# Altium footprint library 2.52-直插元件.PcbLib: 467 footprints (part 7 of 30)
Each footprint in its own frame and in the unit in brackets; x right, y up, seen from the top. Pads: shape width x height; smd on the part's side, far side on the other; paste and mask are expansions set on the pad; w line width, h text height; cw(c..) or ccw(c..) is an arc to the next point about the centre after c.
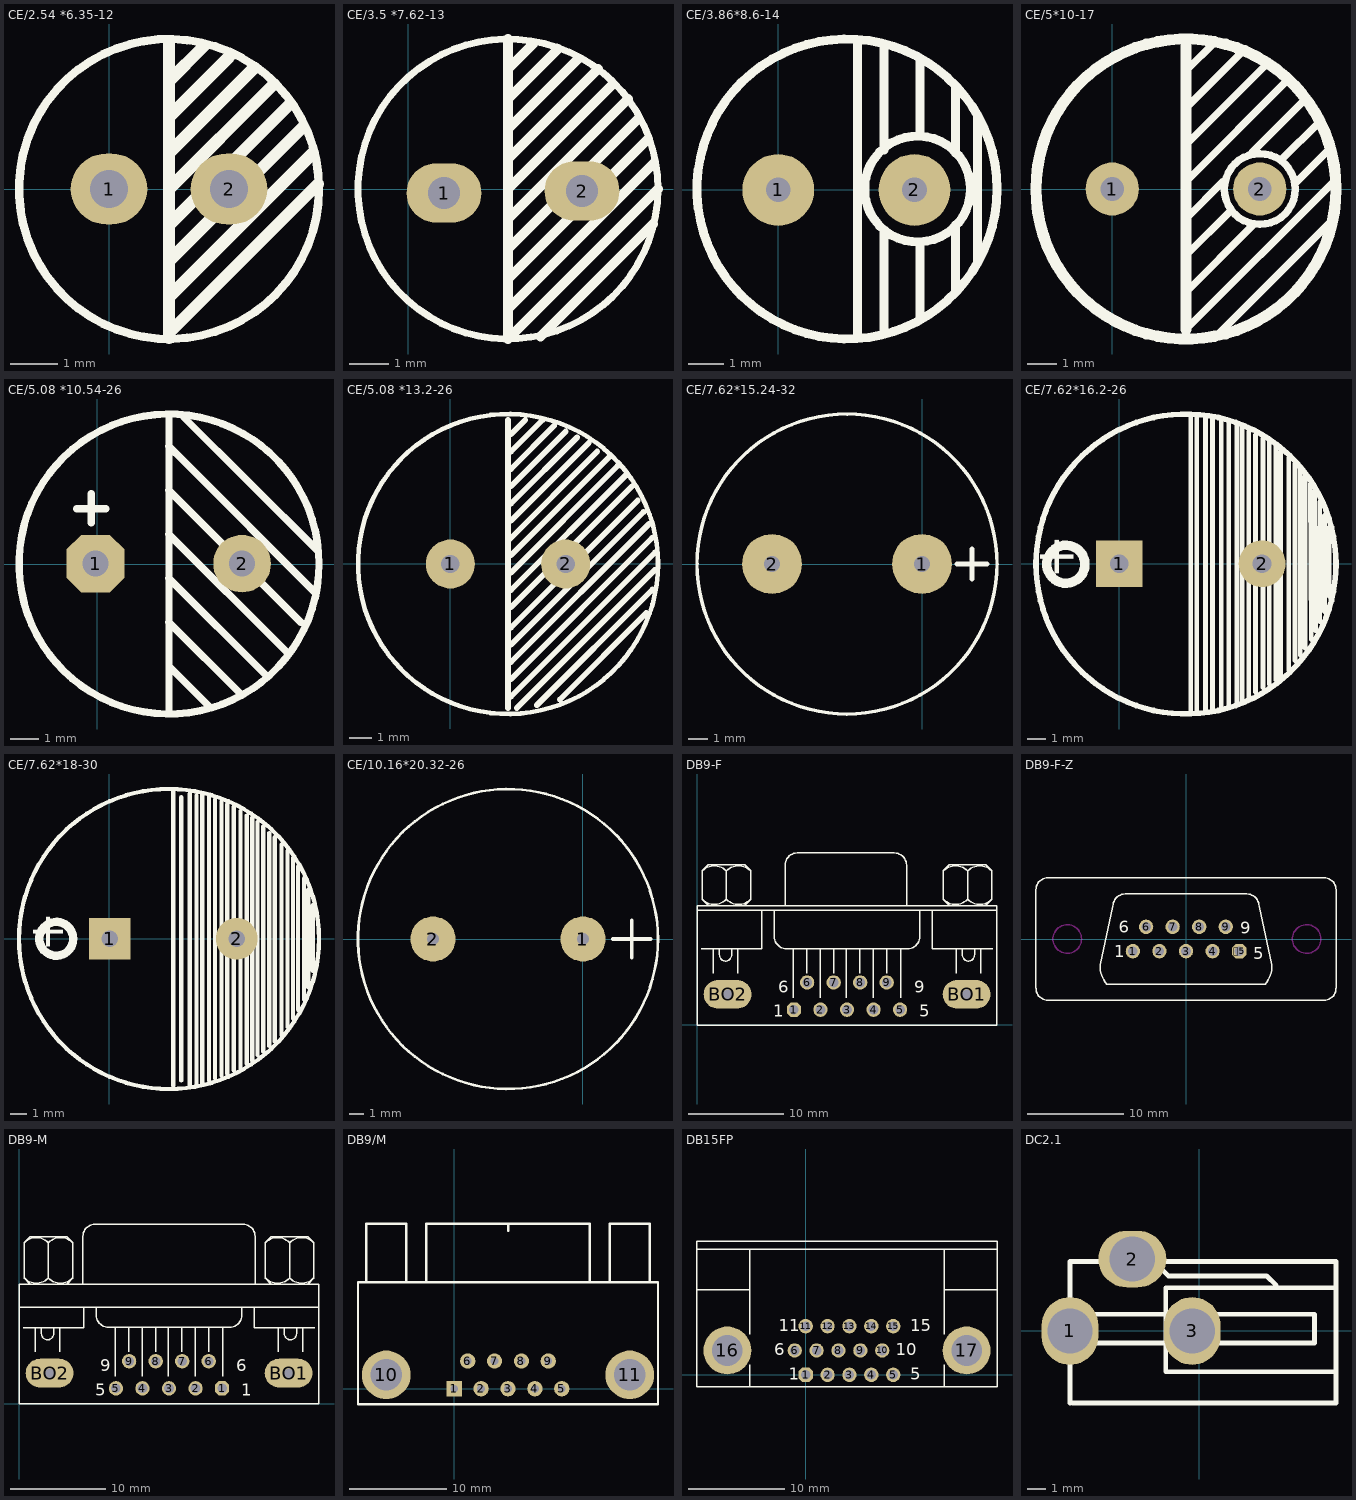
[diagram p6: the footprints below, top view; thin cyan lines are the x and y axes]

## CE/2.54 *6.35-12 [mil]
pads (2):
  oval 64x59.06 hole 32: 1(0,0) 2(100,0)
Top Overlay:
  circle w7: c50,0 r125
  lines w10: 50,-124 50,122 ; 50,-90 170,30 ; 50,-60 161,51 ; 50,-30 149,69 ; 50,0 136,86 ; 50,30 120,100 ; 50,60 100,110 ; 50,90 79,119 ; 51,-119 174,4
3D body "User Library-Cap electro 6_3x12_5x2_5mm.STEP": height 512.81, standoff -118.67, extent -74,-123.02 176.03,127.02

## CE/3.5 *7.62-13 [mil]
pads (2):
  oval 75x59.06 hole 32: 1(36,-4) 2(174,-2)
Top Overlay:
  circle w7: c100,0 r150
  lines w10: 100,-120 245,25 ; 100,-90 240,50 ; 100,-60 230,70 ; 100,-30 220,90 ; 100,0 205,105 ; 100,30 190,120 ; 100,60 170,130 ; 100,90 150,140 ; 100,120 125,145 ; 100,150 100,-150 250,0 ; 132.58,-147.42 245,-35
3D body "User Library-CapAluRadial_D80H115.STEP": height 531.81, standoff -98.11, extent -60.61,-171.61 272.61,162

## CE/3.86*8.6-14 [mil]
pads (2):
  round 80 hole 27.56: 1(0,0) 2(152,0)
Top Overlay:
  circle w10: c155.48,1 r59.05
  circle w10: c76.74,1 r167.32
  lines w10: 88.55,-164.35 88.55,166.35 ; 118,-160.42 118,-46.24 ; 118,44.31 118,162.42 ; 158,-144.67 158,-59 ; 158,61 158,146.67 ; 198,-113.17 198,-39 ; 198,41 198,115.17 ; 222.41,-79 222.41,81
3D body "User Library-CE_R150_D320_H570.STEP": height 566.93, standoff -114.17, extent -85.42,-160.83 237.42,162

## CE/5*10-17 [mm]
pads (2):
  round 1.8 hole 0.8: 1(0,0) 2(5,0)
Top Overlay:
  circle w0.254: c5,0 r1.2
  circle w0.381: c2.5,0 r5.08
  lines w0.254: 2.5,-4.75 7.5,0.25 ; 2.5,-3.5 4.75,-1.25 ; 2.5,-2.25 4,-0.75 ; 2.5,-1 3.75,0.25 ; 2.5,0.25 6,3.75 ; 2.5,1.5 5.25,4.25 ; 2.5,4 3.5,5 ; 2.625,2.875 4.5,4.75 ; 3.5,-5 7.5,-1 ; 4.75,1.25 6.5,3 ; 5.75,1 7,2.25 ; 6.25,0.25 7.25,1.25 ; 7.371,-1.589 7.4,-1.425
  lines w0.381: 2.5,-4.75 2.5,4.826
3D body "User Library-Cap electro 10x16x5_0mm.STEP": height 16.53, standoff -3.74, extent -2.551,-5 7.5,5.051

## CE/5.08 *10.54-26 [mm]
pads (2):
  oct 2x2 hole 0.9: 1(-0.051,0.025)
  round 2 hole 0.9: 2(5.029,0.025)
Top Overlay:
  circle w0.254: c2.495,0.013 r5.2
  lines w0.254: -0.711,1.93 0.305,1.93 ; -0.197,1.435 -0.197,2.451 ; 2.488,-2.001 5.028,-4.541 ; 2.488,-0.477 5.882,-3.871 ; 2.488,1.047 6.552,-3.017 ; 2.488,2.571 7.06,-2.001 ; 2.488,4.095 2.996,3.587 7.568,-0.985 ; 2.495,-5.171 2.495,5.098 ; 2.495,-5.056 2.495,-5.049 ; 2.495,-3.532 3.876,-4.913 ; 2.495,-3.024 2.495,-3.017 ; 2.996,5.111 7.62,0.508
3D body "User Library-Panasonic_EEUFK1Cxxx.STEP": height 26.86, standoff -16, extent -2.52,-5.005 7.498,5.004

## CE/5.08 *13.2-26 [mil]
pads (2):
  round 85 hole 32: 1(0,0) 2(200,0)
Top Overlay:
  circle w8: c100,0 r260.19
  lines w10: 100,-250 100,250 ; 100,40 255,195 ; 105,-230 355,20 ; 105,-200 350,45 ; 105,-170 345,70 ; 105,-140 335,90 ; 105,-110 325,110 ; 105,-75 315,135 ; 105,-45 305,155 ; 105,-15 290,170 ; 105,15 275,185 ; 105,75 240,210 ; 105,105 220,220 ; 105,135 200,230 ; 105,165 180,240 ; 105,195 160,250 ; 105,225 130,250 ; 115,-250 354.65,-10.35 ; 150,-245 350.69,-44.31 ; 190.04,-234.96 340,-85
3D body "User Library-Capacitor, Al El, Thru Mt, 2200uF, 25V - CDE #SEK222M025ST.STEP": height 1010, standoff -1121.89, extent -155.69,-253.84 364,265.84

## CE/7.62*15.24-32 [mil] "淘宝ID:黄晶宝石   店铺网址:https://shop463601444.taobao.com"
pads (2):
  round 120 hole 32: 1(0,0) 2(-300,0)
Top Overlay:
  circle w7: c-150,0 r300
  lines w10: 70,0 130,0 ; 100,-30 100,30
3D body "User Library-JAMICON_TK_D(16)F(7_5)L(31_5).STEP": height 1246.34, standoff -54.06, extent -465.55,-320 165.55,309.92

## CE/7.62*16.2-26 [mm]
pads (2):
  rect 2.5x2.5 hole 1: 1(0,0)
  round 2.5 hole 1: 2(7.62,0)
Top Overlay:
  circle w0.3: c3.562,-0.013 r8
  circle w0.508: c-2.845,-0.025 r1.016
  lines w0.254: 3.81,-8.001 3.81,7.925 ; 4.14,-7.798 4.14,7.823 ; 4.597,-7.823 4.597,7.798 ; 4.978,-7.747 4.978,7.696 ; 5.436,-7.671 5.436,7.62 ; 5.842,-7.569 5.842,7.493 ; 6.274,-7.417 6.274,7.366 ; 6.553,-7.29 6.553,7.264 ; 6.909,-7.137 6.909,7.061 ; 7.264,-6.858 7.264,6.883 ; 7.671,-6.604 7.671,6.68 ; 8.001,-6.426 8.001,6.477 ; 8.357,-6.198 8.357,6.248 ; 8.611,-6.045 8.611,5.994 ; 9.042,-5.664 9.042,5.639 ; 9.373,-5.156 9.373,5.334 ; 9.652,-4.877 9.652,5.004 ; 9.906,-4.496 9.906,4.674 ; 10.186,4.267 10.236,-4.039 ; 10.414,3.861 10.465,-3.556 ; 10.693,-3.099 10.693,3.302 ; 10.947,-2.565 10.947,2.591 ; 11.201,-1.753 11.201,1.956
  text "+" at -1.727,-0.813 h3.56
3D body "User Library-CE_R300_D650_H1000.STEP": height 25.9, standoff -3, extent -4.685,-8.231 11.797,8.23

## CE/7.62*18-30 [mm]
pads (2):
  rect 2.5x2.5 hole 1: 1(0.025,0)
  round 2.5 hole 1: 2(7.645,0)
Top Overlay:
  circle w0.254: c3.587,-0.013 r9
  circle w0.508: c-3.175,0 r1.016
  lines w0.254: 3.835,-8.8 3.835,8.8 ; 4.318,-8.509 4.318,8.491 ; 4.826,-8.775 4.826,8.7 ; 5.232,-8.698 5.232,8.6 ; 5.588,-8.648 5.588,8.6 ; 5.994,-8.521 5.994,8.5 ; 6.35,-8.368 6.35,8.357 ; 6.731,-8.216 6.731,8.255 ; 7.087,-8.103 7.087,8.077 ; 7.468,-7.886 7.468,7.925 ; 7.874,-7.759 7.874,7.671 ; 8.255,-7.505 8.255,7.391 ; 8.585,-7.301 8.585,7.264 ; 8.89,-6.971 8.89,7.01 ; 9.246,-6.768 9.246,6.731 ; 9.601,-6.438 9.601,6.35 ; 9.931,-6.158 9.931,6.096 ; 10.338,-5.777 10.338,5.664 ; 10.693,-5.295 10.693,5.283 ; 11.024,-4.787 11.024,4.851 ; 11.328,-4.253 11.328,4.343 ; 11.684,-3.644 11.684,3.632 ; 11.938,-2.907 11.938,2.946 ; 12.217,-1.917 12.217,2.007
  text "+" at -2.057,-0.787 h3.56
3D body "User Library-Capacitor Radial Electrolitic.STEP": height 40.01, standoff -2.7, extent -5.334,-8.966 12.598,9.034

## CE/10.16*20.32-26 [mil]
pads (2):
  round 120 hole 32: 1(0,0) 2(-400,0)
Top Overlay:
  circle w7: c-200,0 r400
  lines w10: 80,0 180,0 ; 130,-50 130,50
3D body "User Library-ECEC2DP271BJ.STEP": height 1034.25, standoff 50, extent -639.07,-424.14 227.07,442

## DB9-F [mm]
pads (11):
  oct 1.5x1.5 hole 1: 1(10.092,1.6)
  round 1.5 hole 1: 2(12.865,1.6) 3(15.638,1.6) 4(18.411,1.6) 5(21.184,1.6) 6(11.468,4.44) 7(14.241,4.44) 8(17.014,4.44) 9(19.787,4.44)
  oval 5x3 hole 1: BO1(28.147,3.2) BO2(3.15,3.2)
Top Overlay:
  lines w0.15: -0.025,11.975 31.301,11.975 ; 0.398,7.95 6.748,7.95 6.748,11.975 ; 0.48,13.138 ccw(c1.753,14.41) 3.025,13.138 ; 0.48,16.106 cw(c1.753,14.834) 3.025,16.106 ; 1.118,12.505 0.483,13.14 0.483,16.104 1.118,16.739 4.928,16.739 5.563,16.104 ; 1.668,5.41 1.668,7.95 ; 2.303,7.95 2.303,7.315 ccw(c2.938,7.315) 3.573,7.315 3.573,7.95 ; 3.018,16.1 3.023,13.14 ; 3.02,13.138 ccw(c4.293,14.41) 5.565,13.138 ; 3.02,16.106 cw(c4.293,14.834) 5.565,16.106 5.563,13.14 4.928,12.505 ; 4.208,5.41 4.208,7.95 ; 8.018,9.271 8.018,11.975 ; 8.043,9.246 ccw(c9.313,9.246) 9.313,7.976 ; 9.161,12.497 9.161,16.764 ; 9.161,16.713 cw(c10.431,16.713) 10.431,17.983 ; 9.288,7.975 21.988,7.975 ; 10.033,2.87 10.033,7.975 ; 10.431,18 20.591,18 ; 11.438,5.41 11.438,7.975 ; 12.835,2.87 12.835,7.975 ; 14.241,5.41 14.241,7.975 ; 15.562,2.87 15.562,7.975 ; 16.993,5.41 16.993,7.975 ; 18.39,2.87 18.39,7.975 ; 19.77,5.41 19.77,7.975 ; 20.591,17.983 cw(c20.591,16.713) 21.861,16.713 ; 21.243,2.87 21.243,7.975 ; 21.861,12.497 21.861,16.764 ; 21.988,7.976 ccw(c21.988,9.246) 23.258,9.246 ; 23.258,9.22 23.258,11.975 ; 24.528,11.975 24.528,7.95 30.878,7.95 ; 25.711,13.138 ccw(c26.983,14.41) 28.255,13.138 ; 25.713,16.104 26.348,16.739 30.158,16.739 30.793,16.104 30.793,13.14 30.158,12.505 ; 26.348,12.505 25.713,13.14 25.711,16.106 cw(c26.983,14.834) 28.255,16.106 ; 27.068,5.41 27.068,7.95 ; 27.703,7.95 27.703,7.315 ccw(c28.338,7.315) 28.973,7.315 28.973,7.95 ; 28.251,13.138 ccw(c29.523,14.41) 30.795,13.138 ; 28.251,16.106 cw(c29.523,14.834) 30.795,16.106 ; 28.253,13.14 28.258,16.1 ; 29.608,5.41 29.608,7.95 ; -0.025,-0.025 31.301,-0.025 31.301,12.475 -0.025,12.475 -0.025,-0.025
  text "6" at 8.441,3.378 h1.27
  text "1" at 7.933,0.838 h1.27
  text "5" at 23.173,0.838 h1.27
  text "9" at 22.665,3.378 h1.27
Keep-Out Layer:
  lines w1: 1.65,3.2 4.65,3.2 ; 26.647,3.2 29.647,3.2
3D body "User Library-DRB-9FA.STEP": height 12.6, standoff -4, extent 0.238,0.03 31.038,17.93

## DB9-F-Z [mm]
pads (9):
  round 1.5 hole 1: 1(-5.546,-1.27) 2(-2.773,-1.27) 3(0,-1.27) 4(2.773,-1.27) 6(-4.17,1.27) 7(-1.397,1.27) 8(1.376,1.27) 9(4.149,1.27)
  oct 1.5x1.5 hole 1: 5(5.546,-1.27)
Top Overlay:
  lines w0.15: -15.663,-5.13 ccw(c-14.393,-5.13) -14.393,-6.4 14.393,-6.4 ccw(c14.393,-5.13) 15.663,-5.13 15.663,5.13 ccw(c14.393,5.13) 14.393,6.4 -14.393,6.4 ccw(c-14.393,5.13) -15.663,5.13 -15.663,-5.13 ; -8.953,-3.003 ccw(c-6.553,-3.003) -8.25,-4.7 8.25,-4.7 ccw(c6.553,-3.003) 8.953,-3.003 8.953,-2.694 7.623,3.43 ccw(c6.353,3.43) 6.353,4.7 6.25,4.7 -6.25,4.7 -6.353,4.7 ccw(c-6.353,3.43) -7.623,3.43 -8.953,-2.694 -8.953,-3.003
  text "9" at 5.649,0.558 h1.27
  text "5" at 7.009,-2.115 h1.27
  text "1" at -7.506,-1.908 h1.27
  text "6" at -7.045,0.627 h1.27
Keep-Out Layer:
  circle w0.15: c-12.402,0 r1.5
  circle w0.15: c12.596,0 r1.5
3D body "User Library-con-116-1.step": height 12.8, standoff -4.1, extent -15.499,-6.2 15.499,6.2

## DB9-M [mm]
pads (11):
  oct 1.5x1.5 hole 1: 1(21.209,1.626)
  round 1.5 hole 1: 2(18.436,1.626) 3(15.663,1.626) 4(12.89,1.626) 5(10.118,1.626) 6(19.812,4.466) 7(17.039,4.466) 8(14.266,4.466) 9(11.493,4.466)
  oval 5x3 hole 1: BO1(28.173,3.225) BO2(3.175,3.225)
Top Overlay:
  lines w0.15: 0,10.1 31.327,10.1 ; 0.423,7.976 6.773,7.976 6.773,10.1 ; 0.506,13.163 ccw(c1.778,14.436) 3.05,13.163 ; 0.506,16.867 cw(c1.778,15.595) 3.05,16.867 ; 1.143,12.531 0.508,13.166 0.508,16.865 1.143,17.5 4.953,17.5 5.588,16.865 ; 1.693,5.436 1.693,7.976 ; 2.328,7.976 2.328,7.341 ccw(c2.963,7.341) 3.598,7.341 3.598,7.976 ; 3.043,16.867 3.048,13.166 ; 3.046,13.163 ccw(c4.318,14.436) 5.59,13.163 ; 3.046,16.867 cw(c4.318,15.595) 5.59,16.867 ; 4.233,5.436 4.233,7.976 ; 4.953,12.531 5.588,13.166 5.591,16.865 ; 6.663,12.5 6.663,17.53 cw(c7.933,17.53) 7.933,18.8 23.393,18.8 cw(c23.393,17.53) 24.663,17.53 24.663,12.5 ; 8.043,9.296 8.043,10.1 ; 8.069,9.271 ccw(c9.339,9.271) 9.339,8.001 ; 9.313,8 22.013,8 ; 10.058,2.896 10.058,8 ; 11.464,5.436 11.464,8 ; 12.861,2.896 12.861,8 ; 14.266,5.436 14.266,8 ; 15.587,2.896 15.587,8 ; 17.018,5.436 17.018,8 ; 18.415,2.896 18.415,8 ; 19.795,5.436 19.795,8 ; 21.268,2.896 21.268,8 ; 22.013,8.001 ccw(c22.013,9.271) 23.283,9.271 ; 23.283,9.246 23.283,10.1 ; 24.553,10.1 24.553,7.976 30.903,7.976 ; 25.736,16.865 25.739,13.166 26.374,12.531 ; 25.736,13.163 ccw(c27.009,14.436) 28.281,13.163 ; 25.736,16.867 cw(c27.009,15.595) 28.281,16.867 ; 25.739,16.865 26.374,17.5 30.184,17.5 30.819,16.865 30.819,13.166 30.184,12.531 ; 27.093,5.436 27.093,7.976 ; 27.728,7.976 27.728,7.341 ccw(c28.363,7.341) 28.998,7.341 28.998,7.976 ; 28.276,13.163 ccw(c29.549,14.436) 30.821,13.163 ; 28.276,16.867 cw(c29.549,15.595) 30.821,16.867 ; 28.279,13.166 28.284,16.867 ; 29.633,5.436 29.633,7.976 ; 0,0 0,12.5 31.327,12.5 31.327,0 0,0
  text "6" at 22.691,3.404 h1.27
  text "1" at 23.199,0.864 h1.27
  text "5" at 7.959,0.864 h1.27
  text "9" at 8.467,3.404 h1.27
Keep-Out Layer:
  lines w1: 1.675,3.225 4.675,3.225 ; 26.673,3.225 29.673,3.225
3D body "User Library-DRB-9MB.STEP": height 12.6, standoff -4, extent 0.231,-0.004 31.031,20.496

## DB9/M [mm]
pads (11):
  rect 1.575x1.575 hole 0.8: 1(0,0)
  round 1.575 hole 0.8: 2(2.76,0) 3(5.52,0) 4(8.28,0) 5(11.04,0) 6(1.38,2.84) 7(4.14,2.84) 8(6.9,2.84) 9(9.66,2.84)
  round 5 hole 3.25: 10(-6.98,1.42) 11(18.02,1.42)
Top Overlay:
  lines w0.254: -9.05,10.92 -9.05,16.92 -4.94,16.92 ; -4.91,10.92 -4.91,16.92 ; -2.85,10.92 -2.85,16.92 13.9,16.92 13.9,10.92 ; 5.525,16.2 5.525,16.9 ; 15.95,10.92 15.95,16.92 20.06,16.92 ; 20.09,10.92 20.09,16.92 ; -9.88,-1.58 20.92,-1.58 20.92,10.92 -9.88,10.92 -9.88,-1.58
3D body "SW3dPS-9-PIN_DSUB-1.STEP": height 12.81, standoff -2.91, extent -9.925,-2.012 20.885,17.063

## DB15FP [mm]
pads (17):
  oct 1.5x1.5 hole 1: 1(0.005,0.007)
  round 1.5 hole 1: 2(2.291,0.007) 3(4.577,0.007) 4(6.863,0.007) 5(9.149,0.007) 6(-1.138,2.547) 7(1.148,2.547) 8(3.434,2.547) 9(5.72,2.547) 10(8.006,2.547) 11(0.005,5.087) 12(2.291,5.087) 13(4.577,5.087) 14(6.863,5.087) 15(9.149,5.087)
  round 5 hole 3.2: 16(-8.165,2.547) 17(16.812,2.547)
Top Overlay:
  lines w0.15: -11.34,8.897 -5.837,8.897 ; -11.34,13.13 19.987,13.13 ; -5.837,-1.263 -5.837,1.065 ; -5.837,4.24 -5.837,8.897 ; -5.837,13.13 -5.837,8.897 ; 14.483,-1.263 14.483,1.065 ; 14.483,4.24 14.483,8.897 ; 14.483,13.13 14.483,8.897 ; 19.987,8.897 14.483,8.897 ; -11.34,-1.263 19.987,-1.263 19.987,13.977 -11.34,13.977 -11.34,-1.263
  text "1" at -1.773,-0.501 h1.27
  text "6" at -3.297,2.039 h1.27
  text "11" at -2.789,4.579 h1.27
  text "15" at 10.927,4.579 h1.27
  text "10" at 9.403,2.039 h1.27
  text "5" at 10.927,-0.501 h1.27
3D body "User Library-Connector, D-Sub, 15 pin HD, RA, Receptacle.step": height 12.27, standoff -3.77, extent -11.082,-0.854 19.728,20.246

## DC2.1 [mm]
pads (3):
  oval 3x3.6 hole 2.4: 1(-6.858,0) 3(-0.381,0)
  oval 3.6x3 hole 2.4: 2(-3.556,3.81)
Top Overlay:
  lines w0.254: -6.858,-3.81 -6.858,3.683 7.239,3.683 7.239,-3.81 -6.731,-3.81 ; -6.858,-0.508 -6.731,-0.635 6.096,-0.635 6.096,0.889 -6.858,0.889 ; -2.286,3.556 -1.651,2.921 3.556,2.921 4.064,2.413 ; 7.239,-2.159 -1.778,-2.159 -1.778,2.286 7.239,2.286